# Altium footprint library OT Library.PcbLib: 396 footprints (part 19 of 25)
Each footprint in its own frame and in the unit in brackets; x right, y up, seen from the top. Pads: shape width x height; smd on the part's side, far side on the other; paste and mask are expansions set on the pad; w line width, h text height; cw(c..) or ccw(c..) is an arc to the next point about the centre after c.
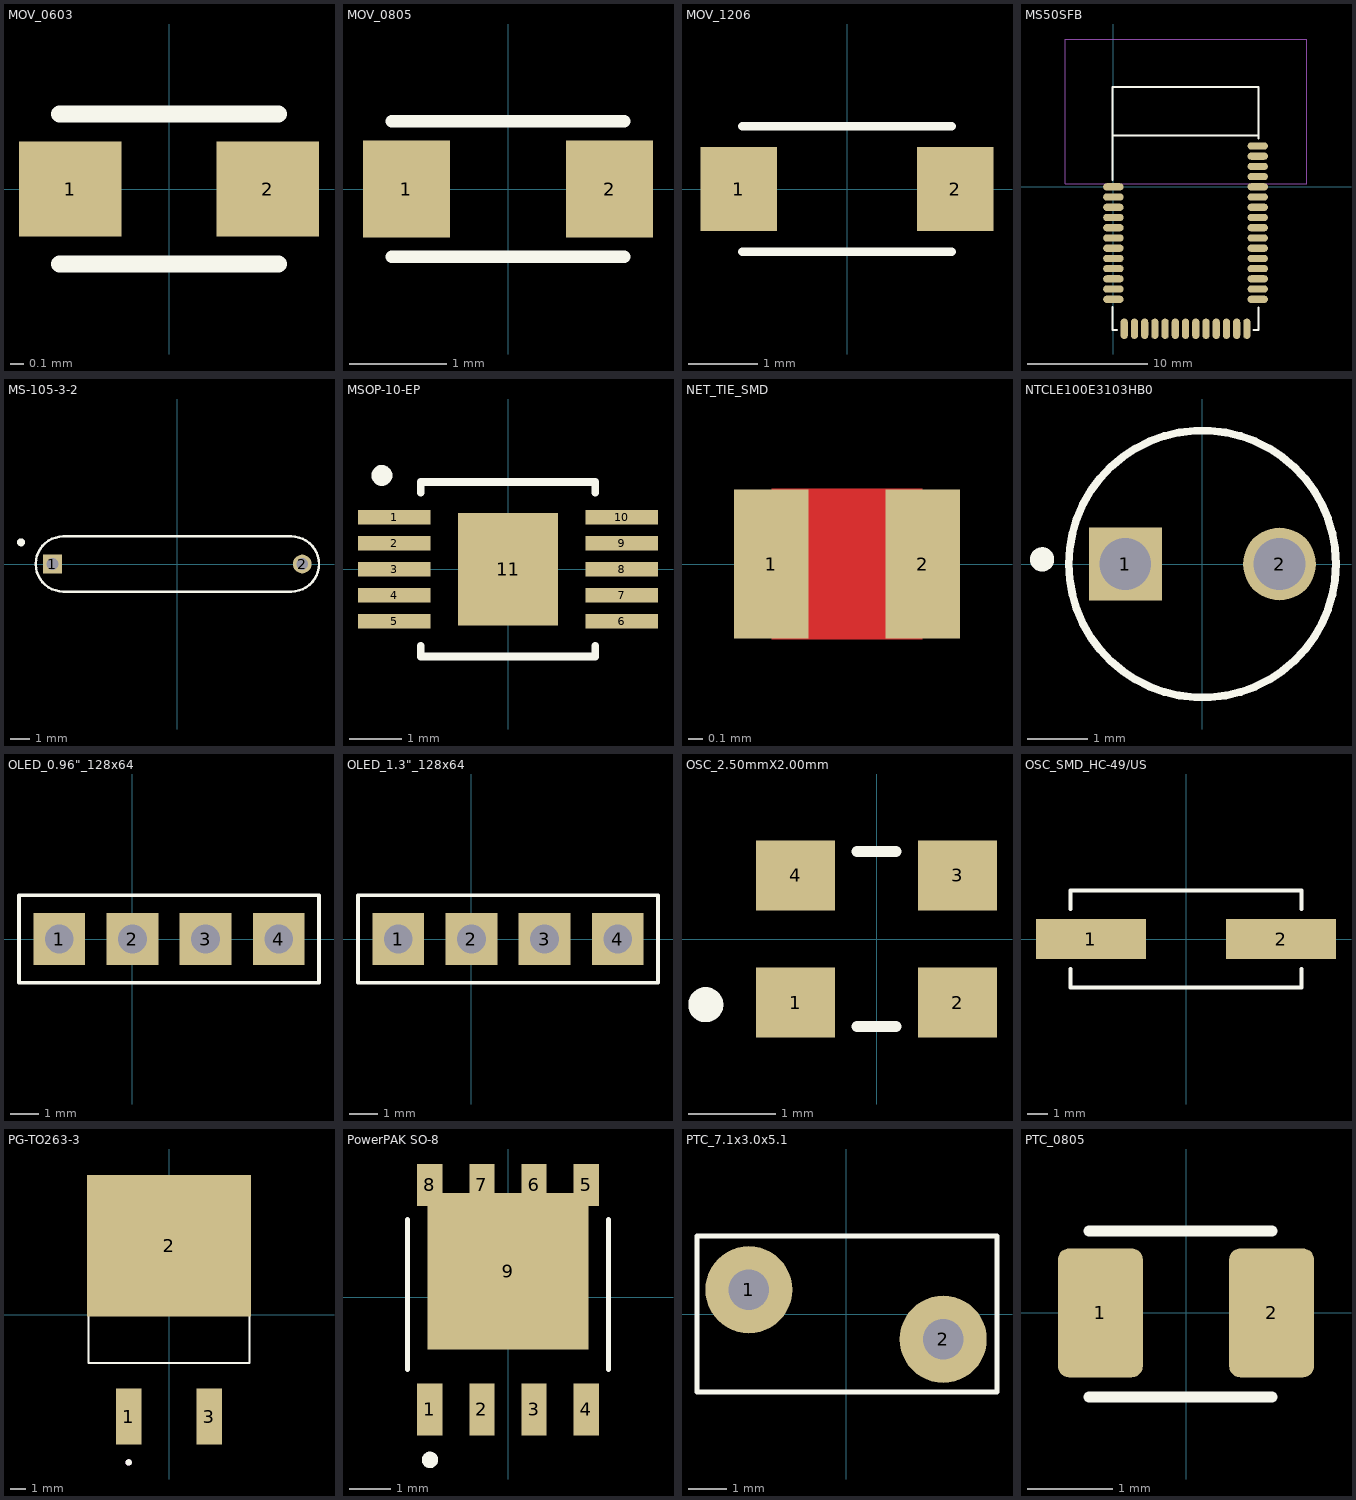
[diagram p18: the footprints below, top view; thin cyan lines are the x and y axes]

## MOV_0603 [mm] "SMD Varistor, 2-Leads, body 1.60x0.80mm"
height 0.9
pads (2):
  rect 0.75x0.7 smd: 1(-0.725,0) 2(0.725,0)
Top Overlay:
  lines w0.127: -0.8,-0.55 0.8,-0.55 ; -0.8,0.55 0.8,0.55
3D body: height 0.8, standoff 0, extent -0.8,-0.4 0.8,0.4

## MOV_0805 [mm] "SMD Varistor, 2-Leads, body 2.00x1.25mm"
height 1
pads (2):
  rect 0.9x1 smd: 1(-1.05,0) 2(1.05,0)
Top Overlay:
  lines w0.127: -1.2,-0.7 1.2,-0.7 ; -1.2,0.7 1.2,0.7
3D body: height 0.9, standoff 0, extent -1,-0.625 1,0.625

## MOV_1206 [mm] "SMD Varistor, 2-Leads, body 3.20x1.60mm"
height 1.7
pads (2):
  rect 1.1x1.2 smd: 1(-1.55,0) 2(1.55,0)
Top Overlay:
  lines w0.127: -1.5,-0.9 1.5,-0.9 ; -1.5,0.9 1.5,0.9
3D body: height 1.7, standoff 0, extent -1.6,-0.8 1.6,0.8

## MS50SFB [mm] "Respect stay away lines if not model 3"
pads (41):
  oval 1.7x0.6 smd mask+0.06: 1(0,0) 2(0,-0.85) 3(0,-1.7) 4(0,-2.55) 5(0,-3.4) 6(0,-4.25) 7(0,-5.1) 8(0,-5.95) 9(0,-6.8) 10(0,-7.65) 11(0,-8.5) 12(0,-9.35) 26(12,-9.35) 27(12,-8.5) 28(12,-7.65) 29(12,-6.8) 30(12,-5.95) 31(12,-5.1) 32(12,-4.25) 33(12,-3.4) 34(12,-2.55) 35(12,-1.7) 36(12,-0.85) 37(12,0) 38(12,0.85) 39(12,1.701) 40(12,2.551) 41(12,3.401)
  oval 0.6x1.7 smd mask+0.06: 13(0.9,-11.8) 14(1.75,-11.8) 15(2.6,-11.8) 16(3.45,-11.8) 17(4.3,-11.8) 18(5.15,-11.8) 19(6,-11.8) 20(6.85,-11.8) 21(7.7,-11.8) 22(8.55,-11.8) 23(9.4,-11.8) 24(10.25,-11.8) 25(11.1,-11.8)
Top Overlay:
  lines w0.16: -0.075,-9.973 -0.075,-11.884 0.3,-11.884 ; -0.075,0.582 -0.075,8.291 12.075,8.291 12.075,4 ; -0.061,4.265 12.075,4.265 ; 11.643,-11.884 12.075,-11.884 12.075,-10.015
Top Component Outline:
  lines w0.1: -4,0.265 16.075,0.265 16.075,12.291 -4,12.291 -4,0.265
  text "STAY AWAY" at 2.31,5.81 h1.52
3D body: height 0.6, standoff 0, extent 0.025,-11.784 11.975,8.166
3D body: height 2, standoff 0.6, extent 0.9,-10.494 11.1,3.401

## MS-105-3-2 [mm]
pads (2):
  rect 0.95x0.95 hole 0.6: 1(-6.35,0)
  round 0.95 hole 0.6: 2(6.35,0)
Top Overlay:
  circle w0.2: c-7.95,1.1 r0.1
  lines w0.127: -7.2,0 ccw(c-5.8,0) -5.8,-1.4 5.8,-1.4 ccw(c5.8,0) 7.2,0 ccw(c5.8,0) 5.8,1.4 -5.8,1.4 ccw(c-5.8,0) -7.2,0
3D body: height 3.2, standoff -3.4, extent -7.2,-1.4 7.2,1.4

## MSOP-10-EP [mil] "10-TFSOP, 10-MSOP (0.118\", 3.00mm Width) Exposed Pad"
pads (11):
  rect 55x11 smd: 1(-86,39.4) 2(-86,19.7) 3(-86,0) 4(-86,-19.7) 5(-86,-39.4) 6(86,-39.4) 7(86,-19.7) 8(86,0) 9(86,19.7) 10(86,39.4)
  rect 76x85 smd: 11(0,0)
Top Overlay:
  circle w7.87: c-95.39,71.1 r3.94
  lines w6: -66,-58 -66,-66 66,-66 66,-58 ; -66,58 -66,66 66,66 66,58
3D body: height 40.16, standoff -3.15, extent -96.47,-59.07 96.45,59.05

## NET_TIE_SMD [mm]
pads (2):
  rect 0.5x1 smd mask-1: 1(0.762,0)
  rect 0.5x1 smd paste+0 mask-1: 2(1.778,0)
Top Layer:
  rectangle: 0.762,-0.508 1.778,0.508

## NTCLE100E3103HB0 [mm]
height 12.5
pads (2):
  rect 1.2x1.2 hole 0.85: 1(-1.27,0)
  round 1.2 hole 0.85: 2(1.27,0)
Top Overlay:
  circle w0.127: c0,0 r2.2
  circle w0.2: c-2.642,0.076 r0.1
3D body: height 6.99, standoff -17, extent -1.9,-1.502 1.9,1.502

## OLED_0.96"_128x64 [mm]
pads (4):
  rect 1.8x1.8 hole 1: 1(-2.54,0) 2(0,0) 3(2.54,0) 4(5.08,0)
Top Overlay:
  lines w0.127: -3.937,-1.524 -3.937,1.524 6.477,1.524 6.477,-1.524 -3.937,-1.524
3D body: height 5.75, standoff -5.25, extent -12.93,-25.876 15.47,1.524

## OLED_1.3"_128x64 [mm]
pads (4):
  rect 1.8x1.8 hole 1: 1(-2.54,0) 2(0,0) 3(2.54,0) 4(5.08,0)
Top Overlay:
  lines w0.127: -3.937,-1.524 6.477,-1.524 6.477,1.524 -3.937,1.524 -3.937,-1.524
3D body: height 6.05, standoff -5.45, extent -16.43,-32.276 18.97,1.524

## OSC_2.50mmX2.00mm [mm] "0.098\" L x 0.079\" W (2.50mm x 2.00mm)"
height 0.65
pads (4):
  rect 0.9x0.8 smd: 1(-0.925,-0.725) 2(0.925,-0.725) 3(0.925,0.725) 4(-0.925,0.725)
Top Overlay:
  circle w0.2: c-1.95,-0.75 r0.1
  lines w0.127: -0.221,-1 0.221,-1 ; -0.221,1 0.221,1
3D body: height 0.9, standoff 0, extent -1.25,-1 1.25,1

## OSC_SMD_HC-49/US [mm] "Crystal, 2-Leads, Body 4.70x11.40mm, Pitch 8.80mm, IPC Medium Density"
height 4.2
pads (2):
  rect 5.5x2 smd: 1(-4.75,0) 2(4.75,0)
Top Overlay:
  lines w0.2: -5.775,-1.5 -5.775,-2.425 5.775,-2.425 5.775,-1.5 ; -5.775,1.5 -5.775,2.425 5.775,2.425 5.775,1.5
3D body: height 4.2, standoff 0, extent -6.35,-2.35 6.35,2.35

## PG-TO263-3 [mm] "TO-263-3, D2PAK (2 Leads + Tab), TO-263AB"
pads (3):
  rect 1.6x3.5 smd: 1(-2.54,-6.4) 3(2.54,-6.4)
  rect 10.3x8.9 smd paste-5: 2(0,4.35)
Top Overlay:
  circle w0.2: c-2.54,-9.29 r0.1
  lines w0.127: -3.515,5.973 -5.08,5.973 -5.08,-3.043 5.08,-3.043 5.08,5.973 3.515,5.973
Top Paste:
  region: 2.545,0.735 0.645,0.735 0.645,2.055 2.545,2.055
  region: 2.545,2.705 0.645,2.705 0.645,4.025 2.545,4.025
  region: 2.545,6.645 0.645,6.645 0.645,7.965 2.545,7.965
  region: 2.545,4.675 0.645,4.675 0.645,5.995 2.545,5.995
  region: -0.645,0.735 -2.545,0.735 -2.545,2.055 -0.645,2.055
  region: -0.645,2.705 -2.545,2.705 -2.545,4.025 -0.645,4.025
  region: -0.645,6.645 -2.545,6.645 -2.545,7.965 -0.645,7.965
  region: -0.645,4.675 -2.545,4.675 -2.545,5.995 -0.645,5.995
3D Top:
  circle w0.2: c-2.54,-9.29 r0.1
3D body: height 4.83, standoff -0.25, extent -5.08,-7.62 5.08,7.62

## PowerPAK SO-8 [mm]
pads (9):
  rect 0.61x1.27 smd: 1(-1.905,-2.732) 2(-0.635,-2.732) 3(0.635,-2.732) 4(1.905,-2.732)
  rect 0.61x1.02 smd: 5(1.905,2.733) 6(0.635,2.733) 7(-0.635,2.733) 8(-1.905,2.733)
  rect 3.91x3.81 smd paste-3: 9(0,0.628)
Top Overlay:
  circle w0.2: c-1.9,-3.962 r0.1
  lines w0.127: -2.45,-1.762 -2.45,1.888 ; 2.45,-1.762 2.45,1.888
Top Paste:
  region: 1.235,1.833 1.235,-0.577 -1.235,-0.577 -1.235,1.833
3D body: height 1.12, standoff 0, extent -2.578,-3.073 2.578,3.074

## PTC_7.1x3.0x5.1 [mil] "0.280\" L x 0.118\" W (7.10mm x 3.00mm)"
height 433.07
pads (2):
  round 90 hole 42: 1(-100.39,25.59) 2(100.39,-25.59)
Top Overlay:
  lines w5: -154,-80 156,-80 156,81 -154,81 -154,-80
3D body: height 454.72, standoff -277.56, extent -138.76,-58.05 140.76,60.05

## PTC_0805 [mm]
pads (2):
  rrect25% 1x1.52 smd: 1(-1.01,0) 2(1.01,0)
Top Overlay:
  lines w0.127: -1.144,-0.991 1.016,-0.991 ; -1.144,0.965 1.016,0.965
3D body: height 0.68, standoff 0, extent -1.05,-0.7 1.05,0.7